# Altium footprint library TO系列封装.PcbLib: 22 footprints (part 2 of 2)
Each footprint in its own frame and in the unit in brackets; x right, y up, seen from the top. Pads: shape width x height; smd on the part's side, far side on the other; paste and mask are expansions set on the pad; w line width, h text height; cw(c..) or ccw(c..) is an arc to the next point about the centre after c.
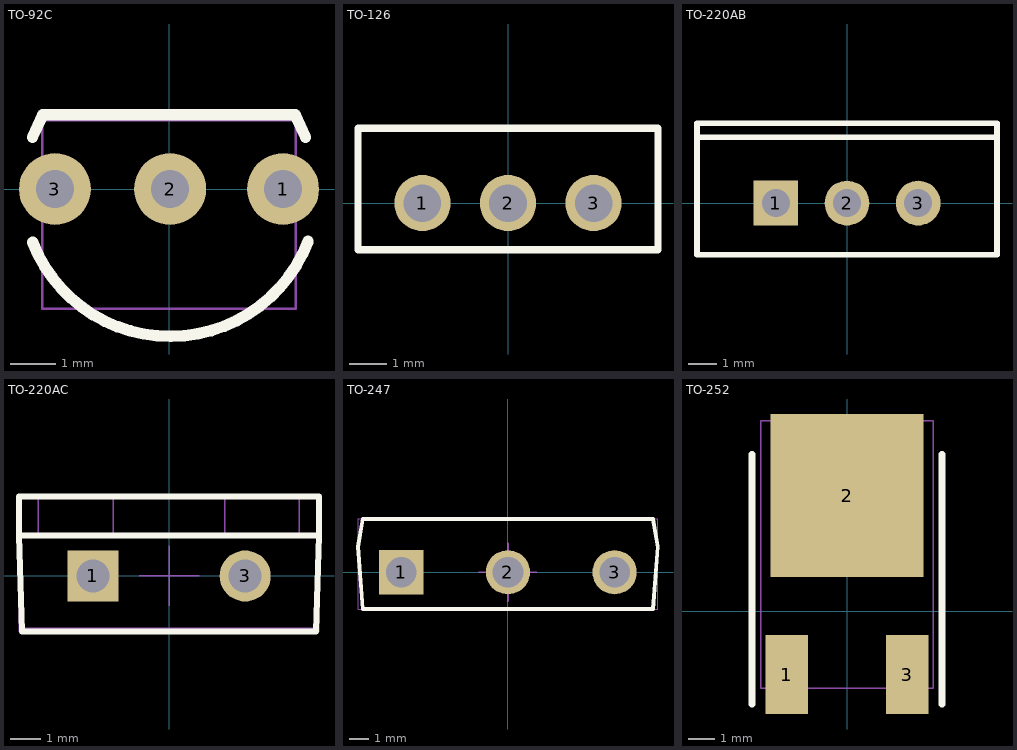
[diagram p1: the footprints below, top view; thin cyan lines are the x and y axes]

## TO-92C [mm]
height 10
pads (3):
  round 1.6 hole 0.85: 1(2.54,0) 2(0.025,0) 3(-2.54,0)
Top Overlay:
  lines w0.25: -3.04,1.153 -2.81,1.651 ; 2.81,1.651 3.04,1.153
  lines w0.254: -3.035,-1.187 ccw(c0.025,0) 3.096,-1.161 ; -2.81,1.651 2.81,1.651
Mechanical 11:
  lines w0.1: -0.5,0 0.5,0 ; 0,-0.5 0,0.5
Mechanical 13:
  lines w0.05: -2.82,-2.666 -2.82,1.524 2.82,1.524 2.82,-2.666 -2.82,-2.666
Mechanical 15:
  lines w0.1: -0.5,0 0.5,0 ; 0,-0.5 0,0.5
3D body "to92-cut-5.stp": height 9.43, standoff -3.9, extent -2.82,-2.666 2.82,1.524

## TO-126 [mm] "SOT-32 [TO-126]晶体管"
height 15
pads (3):
  round 1.5 hole 1: 1(-2.28,0) 2(0,0) 3(2.28,0)
Top Overlay:
  lines w0.2: -4,-1.25 -4,2 4,2 4,-1.25 -4,-1.25
Mechanical 13:
  lines w0.05: -4,-1.25 4,-1.25 4,2 -4,2 -4,-1.25
3D body "to126-cut5.stp": height 14.3, standoff -3.4, extent -4,-1.25 4,2

## TO-220AB [mm] "TO, Thru-Hole, Vertical, Heatsink Mounted; 3 In-Line Leads; Pitch 2.54 mm"
height 19.3
pads (3):
  rect 1.6x1.6 hole 1: 1(-2.54,0)
  round 1.6 hole 1: 2(0,0) 3(2.54,0)
Top Overlay:
  lines w0.2: -5.35,2.35 5.35,2.35 ; -5.35,-1.85 5.35,-1.85 5.35,2.85 -5.35,2.85 -5.35,-1.85
3D body "to220ab-3p.stp": height 23.5, standoff -5, extent -5.1,-1.65 5.1,2.85

## TO-220AC [mm] "TO, Thru-Hole, Vertical, Heatsink Mounted; 3 In-Line Leads (1 Absent); Pitch 2.54 mm"
height 19.2
pads (2):
  rect 1.7x1.7 hole 1.1: 1(-2.54,0)
  round 1.7 hole 1.1: 3(2.54,0)
Top Overlay:
  lines w0.2: -5,1.35 -4.9,-1.85 4.9,-1.85 5,1.35 ; -5,1.35 -5,2.65 5,2.65 5,1.35 ; -5,1.35 5,1.35
Mechanical 13:
  lines w0.05: -5,-1.85 -5,2.65 5,2.65 5,-1.85 -5,-1.85
Mechanical 15:
  lines w0.05: -4.903,-1.75 4.903,-1.75 ; -4.35,1.35 -4.35,2.645 ; -4.25,2.645 -4.25,2.65 ; -1.85,1.35 -1.85,2.645 ; -1,0 1,0 ; 0,-1 0,1 ; 1.85,1.35 1.85,2.645 ; 2.54,-0.25 2.54,0.25 ; 4.25,2.645 4.25,2.65 ; 4.35,1.35 4.35,2.645 ; -5,1.35 5,1.35 ; -5,1.35 -4.9,-1.85 4.9,-1.85 5,1.35 ; -5,1.35 -5,2.65 5,2.65 5,1.35 ; -4.95,1.35 -4.95,2.645 4.95,2.645 4.95,1.35 -4.95,1.35 ; 1.78,-0.25 3.3,-0.25 3.3,0.25 1.78,0.25 1.78,-0.25
3D body "to220ac-2P.stp": height 23.7, standoff -5.08, extent -5,-1.85 5,2.65

## TO-247 [mm] "SIP with Mounting Hole; 3 Leads; Body 20 x 15.6 x 5 mm (typ); Pitch 5.45 mm"
height 24.6
pads (3):
  rect 2.3x2.3 hole 1.6: 1(-5.56,0)
  round 2.3 hole 1.6: 2(0,0) 3(5.56,0)
Top Overlay:
  lines w0.2: -7.81,1.33 -7.56,2.78 7.56,2.78 7.81,1.33 7.56,-1.92 -7.56,-1.92 -7.81,1.33
Mechanical 13:
  lines w0.05: -7.8,-1.92 7.82,-1.92 7.82,2.78 -7.8,2.78 -7.8,-1.92
Mechanical 15:
  lines w0.1: -1.499,0 1.5,0 ; 0,-1.5 0,1.5
3D body "to247-3p.stp": height 27.57, standoff -9, extent -7.8,-1.92 7.82,2.78

## TO-252 [mm] "晶体管,MOS管封装"
height 3
pads (3):
  rect 1.6x3 smd: 1(-2.29,-2.4) 3(2.29,-2.4)
  rect 5.8x6.2 smd: 2(0,4.4)
Top Overlay:
  lines w0.254: -3.607,-3.531 -3.607,5.969 ; 3.607,-3.531 3.607,5.969
Mechanical 13:
  lines w0.05: -3.27,-2.921 3.27,-2.921 3.27,7.236 -3.27,7.236 -3.27,-2.921
3D body "to252 d pak.stp": height 2.43, standoff 0.02, extent -3.27,-2.921 3.27,7.236